# Altium footprint library Footprints.PcbLib: 135 footprints (part 9 of 9)
Each footprint in its own frame and in the unit in brackets; x right, y up, seen from the top. Pads: shape width x height; smd on the part's side, far side on the other; paste and mask are expansions set on the pad; w line width, h text height; cw(c..) or ccw(c..) is an arc to the next point about the centre after c.
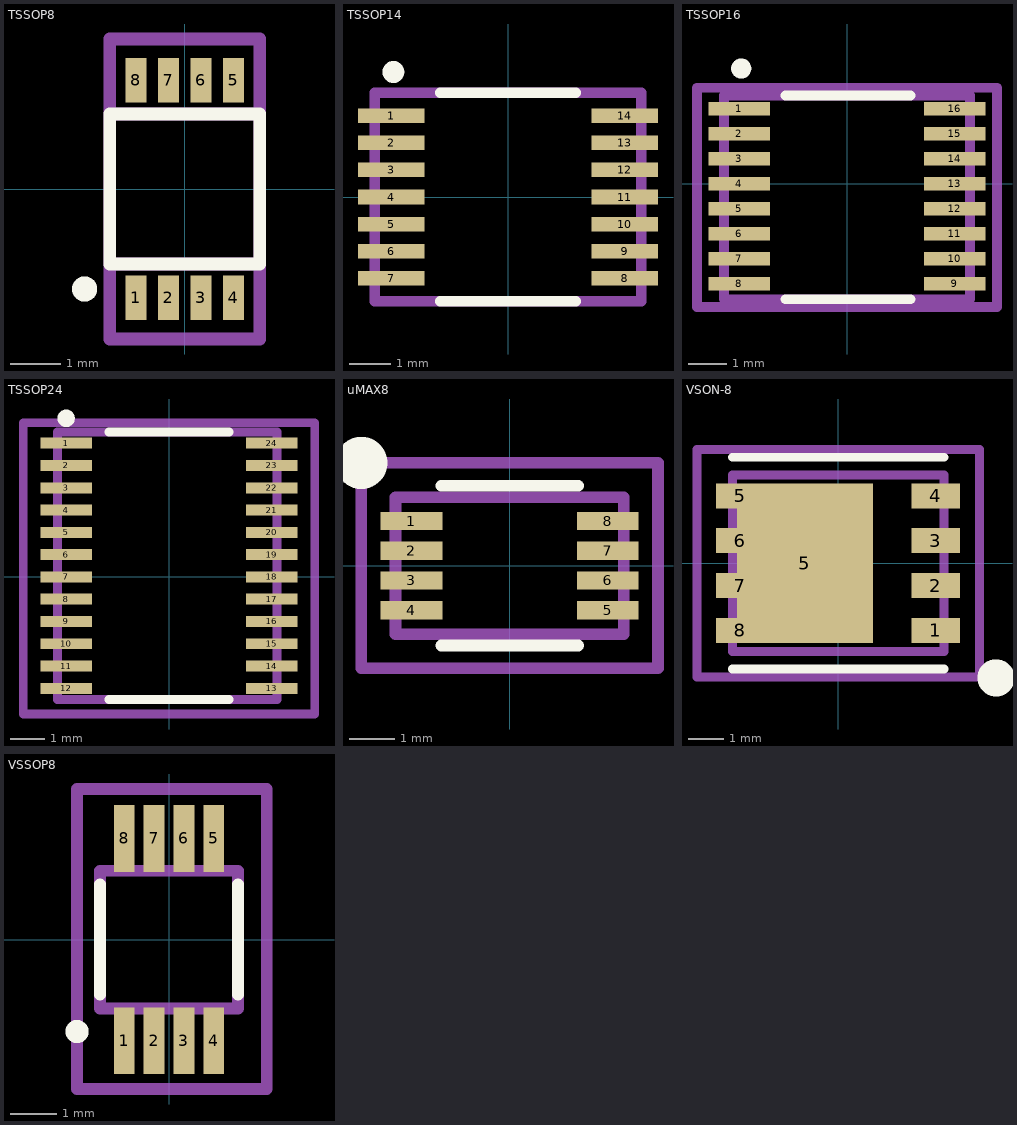
[diagram p8: the footprints below, top view; thin cyan lines are the x and y axes]

## TSSOP8 [mm] "3.1x3.1mm"
height 1.1
pads (8):
  rect 0.42x0.889 smd mask+0.102: 1(-0.975,-2.171) 2(-0.325,-2.171) 3(0.325,-2.171) 4(0.975,-2.171) 5(0.975,2.171) 6(0.325,2.171) 7(-0.325,2.171) 8(-0.975,2.171)
Top Overlay:
  circle w0.254: c-2,-2 r0.125
  lines w0.254: -1.5,-1.5 1.5,-1.5 1.5,1.5 -1.5,1.5 -1.5,-1.5
Mechanical 13:
  lines w0.254: -1.5,-1.5 -1.5,1.5 1.5,1.5 1.5,-1.5 -1.5,-1.5
Mechanical 15:
  lines w0.254: -1.5,-3 -1.5,3 1.5,3 1.5,-3 -1.5,-3
3D body: height 1.1, standoff 0, extent -1.55,-2.475 1.55,2.525

## TSSOP14 [mm] "0.65mm Pitch"
height 1.75
pads (14):
  rect 1.6x0.35 smd mask+0.102: 1(-2.8,1.95) 2(-2.8,1.3) 3(-2.8,0.65) 4(-2.8,0) 5(-2.8,-0.65) 6(-2.8,-1.3) 7(-2.8,-1.95) 8(2.8,-1.95) 9(2.8,-1.3) 10(2.8,-0.65) 11(2.8,0) 12(2.8,0.65) 13(2.8,1.3) 14(2.8,1.95)
Top Overlay:
  circle w0.254: c-2.75,3 r0.135
  lines w0.254: -1.625,-2.5 1.625,-2.5 ; -1.625,2.5 1.625,2.5
Mechanical 13:
  lines w0.254: -3.2,-2.5 3.2,-2.5 3.2,2.5 -3.2,2.5 -3.2,-2.5
3D body: height 1.1, standoff 0, extent -3.2,-2.5 3.2,2.5

## TSSOP16 [mm] "0.65mm Pitch"
height 1.75
pads (16):
  rect 1.6x0.35 smd mask+0.102: 1(-2.8,1.95) 2(-2.8,1.3) 3(-2.8,0.65) 4(-2.8,0) 5(-2.8,-0.65) 6(-2.8,-1.3) 7(-2.8,-1.95) 8(-2.8,-2.6) 9(2.8,-2.6) 10(2.8,-1.95) 11(2.8,-1.3) 12(2.8,-0.65) 13(2.8,0) 14(2.8,0.65) 15(2.8,1.3) 16(2.8,1.95)
Top Overlay:
  circle w0.254: c-2.75,3 r0.135
  lines w0.254: -1.6,-3 1.65,-3 ; -1.6,2.3 1.65,2.3
Mechanical 13:
  lines w0.254: -3.2,-3 3.2,-3 3.2,2.3 -3.2,2.3 -3.2,-3
Mechanical 15:
  lines w0.254: -3.9,-3.2 3.9,-3.2 3.9,2.5 -3.9,2.5 -3.9,-3.2
3D body: height 1.09, standoff 0, extent -3.058,-2.825 3.222,2.175

## TSSOP24 [mm]
height 1.2
pads (24):
  rect 1.5x0.32 smd mask+0.102: 1(-3,3.9) 2(-3,3.25) 3(-3,2.6) 4(-3,1.95) 5(-3,1.3) 6(-3,0.65) 7(-3,0) 8(-3,-0.65) 9(-3,-1.3) 10(-3,-1.95) 11(-3,-2.6) 12(-3,-3.25) 13(3,-3.25) 14(3,-2.6) 15(3,-1.95) 16(3,-1.3) 17(3,-0.65) 18(3,0) 19(3,0.65) 20(3,1.3) 21(3,1.95) 22(3,2.6) 23(3,3.25) 24(3,3.9)
Top Overlay:
  circle w0.254: c-3.002,4.625 r0.127
  lines w0.254: -1.75,-3.575 1.75,-3.575 ; -1.75,4.225 1.75,4.225
Mechanical 13:
  lines w0.254: -3.25,-3.575 3.15,-3.575 3.15,4.225 -3.25,4.225 -3.25,-3.575
Mechanical 15:
  lines w0.254: -4.25,-4 -4.25,4.5 4.25,4.5 4.25,-4 -4.25,-4
3D body: height 1.21, standoff -0.01, extent -3.177,-3.595 3.225,4.204

## uMAX8 [mm]
height 1.1
pads (8):
  rect 1.35x0.4 smd: 1(-2.15,0.975) 2(-2.15,0.325) 3(-2.15,-0.325) 4(-2.15,-0.975) 5(2.15,-0.975) 6(2.15,-0.325) 7(2.15,0.325) 8(2.15,0.975)
Top Overlay:
  circle w1: c-3.25,2.25 r0.071
  lines w0.254: -1.5,-1.75 1.5,-1.75 ; -1.5,1.75 1.5,1.75
Mechanical 13:
  lines w0.254: -2.5,-1.5 -2.5,1.5 2.5,1.5 2.5,-1.5 -2.5,-1.5
Mechanical 15:
  lines w0.254: -3.25,-2.25 3.25,-2.25 3.25,2.25 -3.25,2.25 -3.25,-2.25
3D body: height 0.95, standoff 0, extent -2.5,-1.5 2.5,1.5

## VSON-8 [mm]
height 1
pads (9):
  rect 1.372x0.71 smd paste-10: 1(2.77,-1.905) 2(2.77,-0.635) 3(2.77,0.635) 4(2.77,1.905) 5(-2.77,1.905) 6(-2.77,0.635) 7(-2.77,-0.635) 8(-2.77,-1.905)
  rect 3.85x4.52 smd paste-20: 5(-0.94,0)
Top Overlay:
  circle w1: c4.475,-3.25 r0.025
  lines w0.254: -3,-3 3,-3 ; -3,3 3,3
Top Paste:
  rectangle: -0.55,-2.025 0.75,-1.275
  rectangle: -2.15,-2.025 -0.85,-1.275
  rectangle: -2.15,-0.925 -0.85,-0.175
  rectangle: -0.55,-0.925 0.75,-0.175
  rectangle: -0.55,1.275 0.75,2.025
  rectangle: -2.15,1.275 -0.85,2.025
  rectangle: -2.15,0.175 -0.85,0.925
  rectangle: -0.55,0.175 0.75,0.925
  rectangle: -3.151,1.651 -2.387,2.159
  rectangle: -3.153,0.381 -2.387,0.889
  rectangle: -3.153,-2.159 -2.387,-1.651
  rectangle: -3.153,-0.889 -2.387,-0.381
  rectangle: 2.347,-0.889 3.113,-0.381
  rectangle: 2.347,-2.159 3.113,-1.651
  rectangle: 2.347,0.381 3.113,0.889
  rectangle: 2.349,1.651 3.113,2.159
Mechanical 13:
  lines w0.254: -3,-2.5 3,-2.5 3,2.5 -3,2.5 -3,-2.5
Mechanical 15:
  lines w0.254: -4,-3.225 -4,3.225 4,3.225 4,-3.225 -4,-3.225
3D body: height 1, standoff 0, extent 2.075,-2.175 2.675,-1.575
3D body: height 1, standoff 0, extent -3,-2.5 3,2.5
3D body: height 0.3, standoff 0, extent 2.975,-2.225 3.025,-1.575
3D body: height 0.3, standoff 0, extent 2.975,-0.95 3.025,-0.3
3D body: height 0.3, standoff 0, extent 2.975,0.325 3.025,0.975
3D body: height 0.3, standoff 0, extent 2.975,1.575 3.025,2.225
3D body: height 0.3, standoff 0, extent -3.025,1.575 -2.975,2.225
3D body: height 0.3, standoff 0, extent -3.025,0.3 -2.975,0.95
3D body: height 0.3, standoff 0, extent -3.025,-0.95 -2.975,-0.3
3D body: height 0.3, standoff 0, extent -3.025,-2.225 -2.975,-1.575

## VSSOP8 [mm] "3.1x3.1mm"
height 1.1
pads (8):
  rect 0.45x1.45 smd mask+0.102: 1(-0.975,-2.2) 2(-0.325,-2.2) 3(0.325,-2.2) 4(0.975,-2.2) 5(0.975,2.2) 6(0.325,2.2) 7(-0.325,2.2) 8(-0.975,2.2)
Top Overlay:
  circle w0.254: c-2,-2 r0.125
  lines w0.254: -1.5,-1.2 -1.5,1.2 ; 1.5,-1.2 1.5,1.2
Mechanical 13:
  lines w0.254: -1.5,-1.5 -1.5,1.5 1.5,1.5 1.5,-1.5 -1.5,-1.5
Mechanical 15:
  lines w0.254: -2,-3.25 -2,3.275 2.125,3.275 2.125,-3.25 -2,-3.25
3D body: height 1.1, standoff 0, extent -1.55,-2.475 1.55,2.525